# Altium footprint library Connectors.PcbLib: 133 footprints (part 1 of 9)
Each footprint in its own frame and in the unit in brackets; x right, y up, seen from the top. Pads: shape width x height; smd on the part's side, far side on the other; paste and mask are expansions set on the pad; w line width, h text height; cw(c..) or ccw(c..) is an arc to the next point about the centre after c.
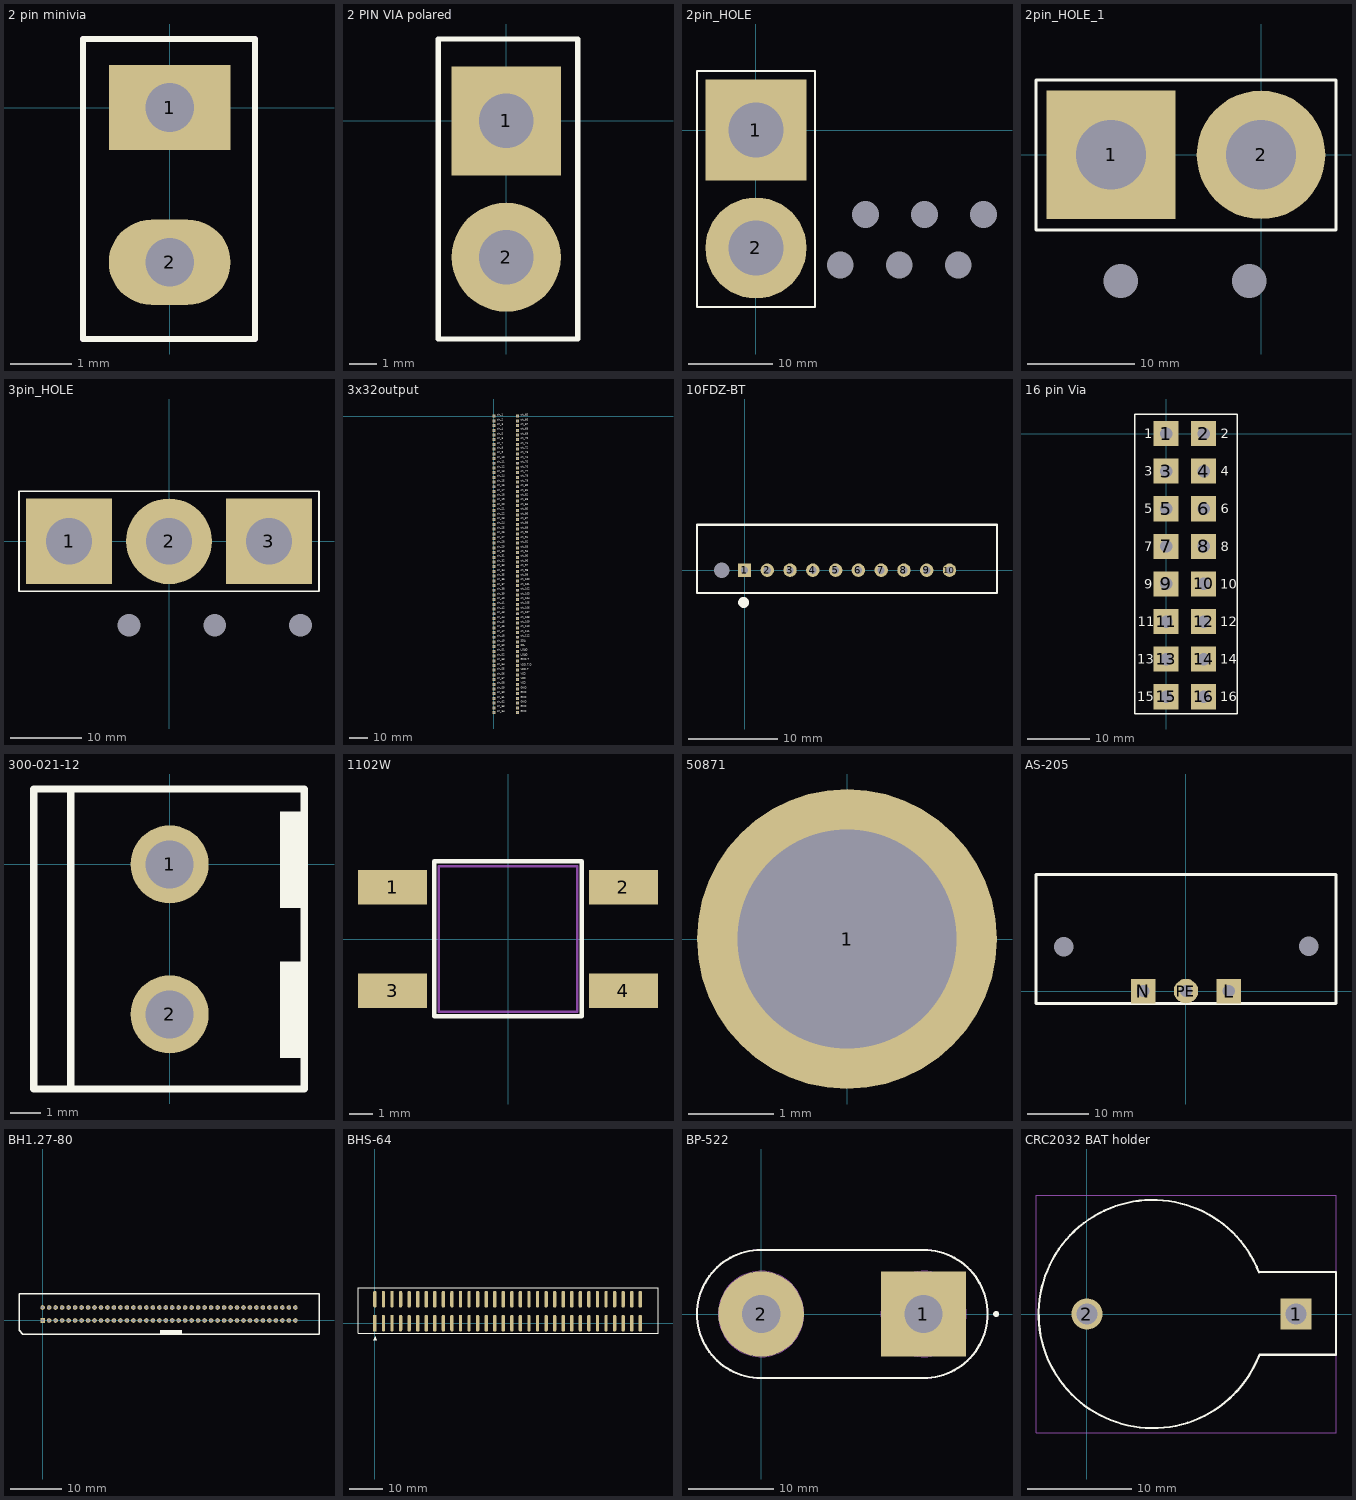
[diagram p0: the footprints below, top view; thin cyan lines are the x and y axes]

## 2 pin minivia [mm]
pads (2):
  rect 2x1.4 hole 0.8: 1(0,0)
  oval 2x1.4 hole 0.8: 2(0,-2.54)
Top Overlay:
  lines w0.1: -1.422,-3.8 -1.422,1.125 1.4,1.125 1.4,-3.8 -1.422,-3.8
Mechanical 29:
  lines w0.1: -1.422,-3.8 -1.422,1.125 1.4,1.125 1.4,-3.8 -1.422,-3.8
  text ".Designator" at 0,0 h1.5

## 2 PIN VIA polared [mm]
pads (2):
  rect 4x4 hole 2: 1(0,0)
  round 4 hole 2: 2(0,-5)
Top Overlay:
  lines w0.2: -2.5,-8 2.625,-8 2.625,3 -2.5,3 -2.5,-8
Bottom Overlay:
  lines w0.2: -2.5,-8 2.625,-8 2.625,3 -2.5,3 -2.5,-8

## 2pin_HOLE [mm]
pads (8):
  rect 12x12 hole 6.5: 1(0,0)
  round 12 hole 6.5: 2(0,-14)
  round 0 hole 3.2 unplated mask+1.7: NPTH(10,-16) NPTH(13,-10) NPTH(17,-16) NPTH(20,-10) NPTH(24,-16) NPTH(27,-10)
Top Overlay:
  lines w0.254: -7,-21 -7,7 7,7 7,-21 -7,-21

## 2pin_HOLE_1 [mm]
pads (4):
  rect 12x12 hole 6.5: 1(-14,0)
  round 12 hole 6.5: 2(0,0)
  round 0 hole 3.2 unplated mask+1.7: NPTH(-13.1,-11.764) NPTH(-1.1,-11.764)
Top Overlay:
  lines w0.254: -21,-7 7,-7 7,7 -21,7 -21,-7

## 3pin_HOLE [mm]
pads (6):
  rect 12x12 hole 6.5: 1(-14,0) 3(14,0)
  round 12 hole 6.5: 2(0,0)
  round 0 hole 3.2 unplated mask+1.7: NPTH(-5.6,-11.764) NPTH(6.4,-11.764) NPTH(18.4,-11.764)
Top Overlay:
  lines w0.254: -21,-7 21,-7 21,7 -21,7 -21,-7

## 3x32output [mm]
pads (128):
  rect 1.6x1.6 hole 1.1: 1(0,0) 2(0,-2.54) 3(0,-5.08) 4(0,-7.62) 5(0,-10.16) 6(0,-12.7) 7(0,-15.24) 8(0,-17.78) 9(0,-20.32) 10(0,-22.86) 11(0,-25.4) 12(0,-27.94) 13(0,-30.48) 14(0,-33.02) 15(0,-35.56) 16(0,-38.1) 17(0,-40.64) 18(0,-43.18) 19(0,-45.72) 20(0,-48.26) 21(0,-50.8) 22(0,-53.34) 23(0,-55.88) 24(0,-58.42) 25(0,-60.96) 26(0,-63.5) 27(0,-66.04) 28(0,-68.58) 29(0,-71.12) 30(0,-73.66) 31(0,-76.2) 32(0,-78.74) 33(0,-81.28) 34(0,-83.82) 35(0,-86.36) 36(0,-88.9) 37(0,-91.44) 38(0,-93.98) 39(0,-96.52) 40(0,-99.06) 41(0,-101.6) 42(0,-104.14) 43(0,-106.68) 44(0,-109.22) 45(0,-111.76) 46(0,-114.3) 47(0,-116.84) 48(0,-119.38) 49(0,-121.92) 50(0,-124.46) 51(0,-127) 52(0,-129.54) 53(0,-132.08) 54(0,-134.62) 55(0,-137.16) 56(0,-139.7) 57(0,-142.24) 58(0,-144.78) 59(0,-147.32) 60(0,-149.86) 61(0,-152.4) 62(0,-154.94) 63(0,-157.48) 64(0,-160.02) 65(12.7,0) 66(12.7,-2.54) 67(12.7,-5.08) 68(12.7,-7.62) 69(12.7,-10.16) 70(12.7,-12.7) 71(12.7,-15.24) 72(12.7,-17.78) 73(12.7,-20.32) 74(12.7,-22.86) 75(12.7,-25.4) 76(12.7,-27.94) 77(12.7,-30.48) 78(12.7,-33.02) 79(12.7,-35.56) 80(12.7,-38.1) 81(12.7,-40.64) 82(12.7,-43.18) 83(12.7,-45.72) 84(12.7,-48.26) 85(12.7,-50.8) 86(12.7,-53.34) 87(12.7,-55.88) 88(12.7,-58.42) 89(12.7,-60.96) 90(12.7,-63.5) 91(12.7,-66.04) 92(12.7,-68.58) 93(12.7,-71.12) 94(12.7,-73.66) 95(12.7,-76.2) 96(12.7,-78.74) 97(12.7,-81.28) 98(12.7,-83.82) 99(12.7,-86.36) 100(12.7,-88.9) 101(12.7,-91.44) 102(12.7,-93.98) 103(12.7,-96.52) 104(12.7,-99.06) 105(12.7,-101.6) 106(12.7,-104.14) 107(12.7,-106.68) 108(12.7,-109.22) 109(12.7,-111.76) 110(12.7,-114.3) 111(12.7,-116.84) 112(12.7,-119.38) 113(12.7,-121.92) 114(12.7,-124.46) 115(12.7,-127) 116(12.7,-129.54) 117(12.7,-132.08) 118(12.7,-134.62) 119(12.7,-137.16) 120(12.7,-139.7) 121(12.7,-142.24) 122(12.7,-144.78) 123(12.7,-147.32) 124(12.7,-149.86) 125(12.7,-152.4) 126(12.7,-154.94) 127(12.7,-157.48) 128(12.7,-160.02)
Top Overlay:
  text "ch_89" at 14.421,-61.29 h1.52
  text "ch_90" at 14.421,-63.83 h1.52
  text "ch_91" at 14.421,-66.37 h1.52
  text "ch_94" at 14.421,-73.99 h1.52
  text "ch_93" at 14.421,-71.45 h1.52
  text "ch_92" at 14.421,-68.91 h1.52
  text "ch_96" at 14.421,-79.07 h1.52
  text "ch_95" at 14.421,-76.53 h1.52
  text "ch_77" at 14.421,-30.81 h1.52
  text "ch_78" at 14.421,-33.35 h1.52
  text "ch_79" at 14.421,-35.89 h1.52
  text "ch_82" at 14.421,-43.51 h1.52
  text "ch_81" at 14.421,-40.97 h1.52
  text "ch_80" at 14.421,-38.43 h1.52
  text "ch_86" at 14.421,-53.67 h1.52
  text "ch_87" at 14.421,-56.21 h1.52
  text "ch_88" at 14.421,-58.75 h1.52
  text "ch_85" at 14.421,-51.13 h1.52
  text "ch_84" at 14.421,-48.59 h1.52
  text "ch_83" at 14.421,-46.05 h1.52
  text "ch_71" at 14.421,-15.57 h1.52
  text "ch_72" at 14.421,-18.11 h1.52
  text "ch_73" at 14.421,-20.65 h1.52
  text "ch_76" at 14.421,-28.27 h1.52
  text "ch_75" at 14.421,-25.73 h1.52
  text "ch_74" at 14.421,-23.19 h1.52
  text "ch_68" at 14.421,-7.95 h1.52
  text "ch_69" at 14.421,-10.49 h1.52
  text "ch_70" at 14.421,-13.03 h1.52
  text "ch_67" at 14.421,-5.41 h1.52
  text "ch_66" at 14.421,-2.87 h1.52
  text "ch_65" at 14.421,-0.33 h1.52
  text "ch_97" at 14.421,-81.61 h1.52
  text "ch_98" at 14.421,-84.15 h1.52
  text "ch_99" at 14.421,-86.69 h1.52
  text "ch_102" at 14.421,-94.31 h1.52
  text "ch_101" at 14.421,-91.77 h1.52
  text "ch_100" at 14.421,-89.23 h1.52
  text "ch_106" at 14.421,-104.47 h1.52
  text "ch_107" at 14.421,-107.01 h1.52
  text "ch_108" at 14.421,-109.55 h1.52
  text "ch_105" at 14.421,-101.93 h1.52
  text "ch_104" at 14.421,-99.39 h1.52
  text "ch_103" at 14.421,-96.85 h1.52
  text "LOAD" at 14.421,-127.33 h1.52
  text "LOAD" at 14.421,-129.87 h1.52
  text "GND.T" at 14.421,-132.41 h1.52
  text "VCCI" at 14.421,-140.03 h1.52
  text "VDD.T" at 14.421,-137.49 h1.2
  text "VDD.T.D" at 14.421,-134.95 h1.2
  text "ch_112" at 14.421,-119.71 h1.52
  text "SDA" at 14.421,-122.25 h1.52
  text "SCL" at 14.421,-124.79 h1.52
  text "ch_111" at 14.421,-117.17 h1.52
  text "ch_110" at 14.421,-114.63 h1.52
  text "ch_109" at 14.421,-112.09 h1.52
  text "GND" at 14.421,-157.81 h1.52
  text "GND" at 14.421,-160.35 h1.52
  text "GND" at 14.421,-150.19 h1.52
  text "GND" at 14.421,-152.73 h1.52
  text "GND" at 14.421,-155.27 h1.52
  text "GND" at 14.421,-147.65 h1.52
  text "VCCI" at 14.421,-145.11 h1.52
  text "VCCI" at 14.421,-142.57 h1.52
  text "ch_57" at 1.746,-142.57 h1.52
  text "ch_58" at 1.746,-145.11 h1.52
  text "ch_59" at 1.746,-147.65 h1.52
  text "ch_62" at 1.746,-155.27 h1.52
  text "ch_61" at 1.746,-152.73 h1.52
  text "ch_60" at 1.746,-150.19 h1.52
  text "ch_64" at 1.746,-160.35 h1.52
  text "ch_63" at 1.746,-157.81 h1.52
  text "ch_45" at 1.746,-112.09 h1.52
  text "ch_46" at 1.746,-114.63 h1.52
  text "ch_47" at 1.746,-117.17 h1.52
  text "ch_50" at 1.746,-124.79 h1.52
  text "ch_49" at 1.746,-122.25 h1.52
  text "ch_48" at 1.746,-119.71 h1.52
  text "ch_54" at 1.746,-134.95 h1.52
  text "ch_55" at 1.746,-137.49 h1.52
  text "ch_56" at 1.746,-140.03 h1.52
  text "ch_53" at 1.746,-132.41 h1.52
  text "ch_52" at 1.746,-129.87 h1.52
  text "ch_51" at 1.746,-127.33 h1.52
  text "ch_39" at 1.746,-96.85 h1.52
  text "ch_40" at 1.746,-99.39 h1.52
  text "ch_41" at 1.746,-101.93 h1.52
  text "ch_44" at 1.746,-109.55 h1.52
  text "ch_43" at 1.746,-107.01 h1.52
  text "ch_42" at 1.746,-104.47 h1.52
  text "ch_36" at 1.746,-89.23 h1.52
  text "ch_37" at 1.746,-91.77 h1.52
  text "ch_38" at 1.746,-94.31 h1.52
  text "ch_35" at 1.746,-86.69 h1.52
  text "ch_34" at 1.746,-84.15 h1.52
  text "ch_33" at 1.746,-81.61 h1.52
  text "ch_1" at 1.746,-0.33 h1.52
  text "ch_2" at 1.746,-2.87 h1.52
  text "ch_3" at 1.746,-5.41 h1.52
  text "ch_6" at 1.746,-13.03 h1.52
  text "ch_5" at 1.746,-10.49 h1.52
  text "ch_4" at 1.746,-7.95 h1.52
  text "ch_10" at 1.746,-23.19 h1.52
  text "ch_11" at 1.746,-25.73 h1.52
  text "ch_12" at 1.746,-28.27 h1.52
  text "ch_9" at 1.746,-20.65 h1.52
  text "ch_8" at 1.746,-18.11 h1.52
  text "ch_7" at 1.746,-15.57 h1.52
  text "ch_19" at 1.746,-46.05 h1.52
  text "ch_20" at 1.746,-48.59 h1.52
  text "ch_21" at 1.746,-51.13 h1.52
  text "ch_24" at 1.746,-58.75 h1.52
  text "ch_23" at 1.746,-56.21 h1.52
  text "ch_22" at 1.746,-53.67 h1.52
  text "ch_16" at 1.746,-38.43 h1.52
  text "ch_17" at 1.746,-40.97 h1.52
  text "ch_18" at 1.746,-43.51 h1.52
  text "ch_15" at 1.746,-35.89 h1.52
  text "ch_14" at 1.746,-33.35 h1.52
  text "ch_13" at 1.746,-30.81 h1.52
  text "ch_31" at 1.746,-76.53 h1.52
  text "ch_32" at 1.746,-79.07 h1.52
  text "ch_28" at 1.746,-68.91 h1.52
  text "ch_29" at 1.746,-71.45 h1.52
  text "ch_30" at 1.746,-73.99 h1.52
  text "ch_27" at 1.746,-66.37 h1.52
  text "ch_26" at 1.746,-63.83 h1.52
  text "ch_25" at 1.746,-61.29 h1.52
Bottom Overlay:
  text "VDD.T" at 17.679,-137.49 h1.2
  text "VDD.T.D" at 18.679,-134.95 h1.2
  text "ch_25" at 5.379,-61.29 h1.52
  text "ch_26" at 5.379,-63.83 h1.52
  text "ch_27" at 5.379,-66.37 h1.52
  text "ch_30" at 5.379,-73.99 h1.52
  text "ch_29" at 5.379,-71.45 h1.52
  text "ch_28" at 5.379,-68.91 h1.52
  text "ch_32" at 5.379,-79.07 h1.52
  text "ch_31" at 5.379,-76.53 h1.52
  text "ch_13" at 5.379,-30.81 h1.52
  text "ch_14" at 5.379,-33.35 h1.52
  text "ch_15" at 5.379,-35.89 h1.52
  text "ch_18" at 5.379,-43.51 h1.52
  text "ch_17" at 5.379,-40.97 h1.52
  text "ch_16" at 5.379,-38.43 h1.52
  text "ch_22" at 5.379,-53.67 h1.52
  text "ch_23" at 5.379,-56.21 h1.52
  text "ch_24" at 5.379,-58.75 h1.52
  text "ch_21" at 5.379,-51.13 h1.52
  text "ch_20" at 5.379,-48.59 h1.52
  text "ch_19" at 5.379,-46.05 h1.52
  text "ch_7" at 4.879,-15.57 h1.52
  text "ch_8" at 4.879,-18.11 h1.52
  text "ch_9" at 4.879,-20.65 h1.52
  text "ch_12" at 5.379,-28.27 h1.52
  text "ch_11" at 5.379,-25.73 h1.52
  text "ch_10" at 5.379,-23.19 h1.52
  text "ch_4" at 4.879,-7.95 h1.52
  text "ch_5" at 4.879,-10.49 h1.52
  text "ch_6" at 4.879,-13.03 h1.52
  text "ch_3" at 4.879,-5.41 h1.52
  text "ch_2" at 4.879,-2.87 h1.52
  text "ch_1" at 4.879,-0.33 h1.52
  text "ch_33" at 5.379,-81.61 h1.52
  text "ch_34" at 5.379,-84.15 h1.52
  text "ch_35" at 5.379,-86.69 h1.52
  text "ch_38" at 5.379,-94.31 h1.52
  text "ch_37" at 5.379,-91.77 h1.52
  text "ch_36" at 5.379,-89.23 h1.52
  text "ch_42" at 5.379,-104.47 h1.52
  text "ch_43" at 5.379,-107.01 h1.52
  text "ch_44" at 5.379,-109.55 h1.52
  text "ch_41" at 5.379,-101.93 h1.52
  text "ch_40" at 5.379,-99.39 h1.52
  text "ch_39" at 5.379,-96.85 h1.52
  text "ch_51" at 5.379,-127.33 h1.52
  text "ch_52" at 5.379,-129.87 h1.52
  text "ch_53" at 5.379,-132.41 h1.52
  text "ch_56" at 5.379,-140.03 h1.52
  text "ch_55" at 5.379,-137.49 h1.52
  text "ch_54" at 5.379,-134.95 h1.52
  text "ch_48" at 5.379,-119.71 h1.52
  text "ch_49" at 5.379,-122.25 h1.52
  text "ch_50" at 5.379,-124.79 h1.52
  text "ch_47" at 5.379,-117.17 h1.52
  text "ch_46" at 5.379,-114.63 h1.52
  text "ch_45" at 5.379,-112.09 h1.52
  text "ch_63" at 5.379,-157.81 h1.52
  text "ch_64" at 5.379,-160.35 h1.52
  text "ch_60" at 5.379,-150.19 h1.52
  text "ch_61" at 5.379,-152.73 h1.52
  text "ch_62" at 5.379,-155.27 h1.52
  text "ch_59" at 5.379,-147.65 h1.52
  text "ch_58" at 5.379,-145.11 h1.52
  text "ch_57" at 5.379,-142.57 h1.52
  text "VCCI" at 17.725,-142.57 h1.52
  text "VCCI" at 17.725,-145.11 h1.52
  text "GND" at 17.325,-147.65 h1.52
  text "GND" at 17.325,-155.27 h1.52
  text "GND" at 17.325,-152.73 h1.52
  text "GND" at 17.325,-150.19 h1.52
  text "GND" at 17.325,-160.35 h1.52
  text "GND" at 17.325,-157.81 h1.52
  text "ch_109" at 18.725,-112.09 h1.52
  text "ch_110" at 18.725,-114.63 h1.52
  text "ch_111" at 18.725,-117.17 h1.52
  text "SCL" at 17.425,-124.79 h1.52
  text "SDA" at 17.425,-122.25 h1.52
  text "ch_112" at 18.725,-119.71 h1.52
  text "VCCI" at 17.725,-140.03 h1.52
  text "GND.T" at 18.9,-132.4 h1.52
  text "LOAD" at 18.225,-129.87 h1.52
  text "LOAD" at 18.225,-127.33 h1.52
  text "ch_103" at 18.725,-96.85 h1.52
  text "ch_104" at 18.725,-99.39 h1.52
  text "ch_105" at 18.725,-101.93 h1.52
  text "ch_108" at 18.725,-109.55 h1.52
  text "ch_107" at 18.725,-107.01 h1.52
  text "ch_106" at 18.725,-104.47 h1.52
  text "ch_100" at 18.725,-89.23 h1.52
  text "ch_101" at 18.725,-91.77 h1.52
  text "ch_102" at 18.725,-94.31 h1.52
  text "ch_99" at 18.225,-86.69 h1.52
  text "ch_98" at 18.225,-84.15 h1.52
  text "ch_97" at 18.225,-81.61 h1.52
  text "ch_65" at 18.225,-0.33 h1.52
  text "ch_66" at 18.225,-2.87 h1.52
  text "ch_67" at 18.225,-5.41 h1.52
  text "ch_70" at 18.225,-13.03 h1.52
  text "ch_69" at 18.225,-10.49 h1.52
  text "ch_68" at 18.225,-7.95 h1.52
  text "ch_74" at 18.225,-23.19 h1.52
  text "ch_75" at 18.225,-25.73 h1.52
  text "ch_76" at 18.225,-28.27 h1.52
  text "ch_73" at 18.225,-20.65 h1.52
  text "ch_72" at 18.225,-18.11 h1.52
  text "ch_71" at 18.225,-15.57 h1.52
  text "ch_83" at 18.225,-46.05 h1.52
  text "ch_84" at 18.225,-48.59 h1.52
  text "ch_85" at 18.225,-51.13 h1.52
  text "ch_88" at 18.225,-58.75 h1.52
  text "ch_87" at 18.225,-56.21 h1.52
  text "ch_86" at 18.225,-53.67 h1.52
  text "ch_80" at 18.225,-38.43 h1.52
  text "ch_81" at 18.225,-40.97 h1.52
  text "ch_82" at 18.225,-43.51 h1.52
  text "ch_79" at 18.225,-35.89 h1.52
  text "ch_78" at 18.225,-33.35 h1.52
  text "ch_77" at 18.225,-30.81 h1.52
  text "ch_95" at 18.225,-76.53 h1.52
  text "ch_96" at 18.225,-79.07 h1.52
  text "ch_92" at 18.225,-68.91 h1.52
  text "ch_93" at 18.225,-71.45 h1.52
  text "ch_94" at 18.225,-73.99 h1.52
  text "ch_91" at 18.225,-66.37 h1.52
  text "ch_90" at 18.225,-63.83 h1.52
  text "ch_89" at 18.225,-61.29 h1.52

## 10FDZ-BT [mm]
height 12.7
pads (11):
  rect 1.5x1.5 hole 0.8: 1(0,0)
  round 1.5 hole 0.8: 2(2.54,0) 3(5.08,0) 4(7.62,0) 5(10.16,0) 6(12.7,0) 7(15.24,0) 8(17.78,0) 9(20.32,0) 10(22.86,0)
  round 0 hole 1.7 unplated: NPTH(-2.54,0)
Top Overlay:
  circle w1: c-0.1,-3.6 r0.1
  lines w0.254: -5.3,-2.54 28.16,-2.54 28.16,0 28.16,5.08 -5.3,5.08 -5.3,0 -5.3,-2.54
3D body "10FDZ-BT.step": height 10.3, standoff -3.4, extent -6.693,-2.599 29.567,5.101

## 16 pin Via [mm]
pads (16):
  rect 4x4 hole 2: 1(0,0) 2(6,0) 3(0,-6) 4(6,-6) 5(0,-12) 6(6,-12) 7(0,-18) 8(6,-18) 9(0,-24) 10(6,-24) 11(0,-30) 12(6,-30) 13(0,-36) 14(6,-36) 15(0,-42) 16(6,-42)
Top Overlay:
  lines w0.2: -5,-44.75 11.375,-44.75 11.375,3.125 -5,3.125 -5,-44.75
  text "2" at 8.75,-0.75 h1.52
  text "4" at 8.75,-6.75 h1.52
  text "6" at 8.75,-12.75 h1.52
  text "8" at 8.75,-18.75 h1.52
  text "10" at 8.625,-24.75 h1.52
  text "14" at 8.625,-36.75 h1.52
  text "16" at 8.625,-42.75 h1.52
  text "12" at 8.625,-30.75 h1.52
  text "11" at -4.5,-30.75 h1.52
  text "15" at -4.625,-42.75 h1.52
  text "13" at -4.625,-36.75 h1.52
  text "9" at -3.5,-24.75 h1.52
  text "7" at -3.5,-18.75 h1.52
  text "5" at -3.5,-12.75 h1.52
  text "3" at -3.5,-6.75 h1.52
  text "1" at -3.5,-0.75 h1.52

## 300-021-12 [mm]
pads (2):
  round 2.6 hole 1.6: 1(0,0) 2(0,-5)
Top Overlay:
  rectangle: 3.683,-1.448 4.479,1.753
  rectangle: 3.683,-6.448 4.479,-3.247
  lines w0.25: -3.302,-7.489 -3.302,2.511 -4.521,2.511 ; -4.521,2.511 4.479,2.511 4.479,-7.489 -4.521,-7.489 -4.521,2.511
3D body "PCB Screw Terminal Block 2P,5mm.STEP": height 15.4, standoff -3.3, extent -4.521,-7.489 4.479,2.511

## 1102W [mm]
height 6
pads (4):
  rect 3x1.5 smd: 1(-5,2.25) 2(5,2.25) 3(-5,-2.25) 4(5,-2.25)
Top Overlay:
  lines w0.2: -3.2,-3.35 3.2,-3.35 3.2,3.375 -3.2,3.375 -3.2,-3.35
Mechanical 15:
  lines w0.1: -3,-3.15 3,-3.15 3,3.15 -3,3.15 -3,-3.15
3D body "TACT SMD 6X6.step": height 5, standoff 0, extent -5,-3 5,3

## 50871 [mm]
pads (1):
  round 3.5 hole 2.56: 1(0,0)
3D body "c-50871-1-ae4-3d.stp": height 0.5, standoff -6.82, extent -1.46,-1.461 1.46,1.46

## AS-205 [mm]
height 30
pads (5):
  rect 4x4 hole 2: L(7,0) N(-7,0)
  round 0 hole 3.2 unplated mask+1.7: NPTH(-19.983,7.264) NPTH(20.022,7.289)
  round 4 hole 2: PE(0,0)
Top Overlay:
  lines w0.5: -24.5,-2 24.5,-2 24.5,19 -24.5,19 -24.5,-2
3D body "AS-205.STEP": height 26.8, standoff -3.8, extent -24.5,-2 24.5,19

## BH1.27-80 [mm] "вилка 1.27 на плату"
pads (80):
  rect 0.9x0.9 hole 0.6: 1(0,0)
  round 0.9 hole 0.6: 2(0,2.54) 3(1.27,0) 4(1.27,2.54) 5(2.54,0) 6(2.54,2.54) 7(3.81,0) 8(3.81,2.54) 9(5.08,0) 10(5.08,2.54) 11(6.35,0) 12(6.35,2.54) 13(7.62,0) 14(7.62,2.54) 15(8.89,0) 16(8.89,2.54) 17(10.16,0) 18(10.16,2.54) 19(11.43,0) 20(11.43,2.54) 21(12.7,0) 22(12.7,2.54) 23(13.97,0) 24(13.97,2.54) 25(15.24,0) 26(15.24,2.54) 27(16.51,0) 28(16.51,2.54) 29(17.78,0) 30(17.78,2.54) 31(19.05,0) 32(19.05,2.54) 33(20.32,0) 34(20.32,2.54) 35(21.59,0) 36(21.59,2.54) 37(22.86,0) 38(22.86,2.54) 39(24.13,0) 40(24.13,2.54) 41(25.4,0) 42(25.4,2.54) 43(26.67,0) 44(26.67,2.54) 45(27.94,0) 46(27.94,2.54) 47(29.21,0) 48(29.21,2.54) 49(30.48,0) 50(30.48,2.54) 51(31.75,0) 52(31.75,2.54) 53(33.02,0) 54(33.02,2.54) 55(34.29,0) 56(34.29,2.54) 57(35.56,0) 58(35.56,2.54) 59(36.83,0) 60(36.83,2.54) 61(38.1,0) 62(38.1,2.54) 63(39.37,0) 64(39.37,2.54) 65(40.64,0) 66(40.64,2.54) 67(41.91,0) 68(41.91,2.54) 69(43.18,0) 70(43.18,2.54) 71(44.45,0) 72(44.45,2.54) 73(45.72,0) 74(45.72,2.54) 75(46.99,0) 76(46.99,2.54) 77(48.26,0) 78(48.26,2.54) 79(49.53,0) 80(49.53,2.54)
Top Overlay:
  rectangle: 23.016,-2.717 27.266,-1.85
  lines w0.254: -4.648,-1.944 -3.874,-2.718 54.178,-2.718 54.178,5.258 -4.648,5.258 -4.648,-1.944
3D body "BH-90MS.STEP": height 7.41, standoff -2.89, extent -4.648,-2.73 54.172,5.27

## BHS-64 [mm]
pads (64):
  rect 1x5 smd: 1(0,0)
  oval 1x5 smd: 2(0,7.112) 3(2.54,0) 4(2.54,7.112) 5(5.08,0) 6(5.08,7.112) 7(7.62,0) 8(7.62,7.112) 9(10.16,0) 10(10.16,7.112) 11(12.7,0) 12(12.7,7.112) 13(15.24,0) 14(15.24,7.112) 15(17.78,0) 16(17.78,7.112) 17(20.32,0) 18(20.32,7.112) 19(22.86,0) 20(22.86,7.112) 21(25.4,0) 22(25.4,7.112) 23(27.94,0) 24(27.94,7.112) 25(30.48,0) 26(30.48,7.112) 27(33.02,0) 28(33.02,7.112) 29(35.56,0) 30(35.56,7.112) 31(38.1,0) 32(38.1,7.112) 33(40.64,0) 34(40.64,7.112) 35(43.18,0) 36(43.18,7.112) 37(45.72,0) 38(45.72,7.112) 39(48.26,0) 40(48.26,7.112) 41(50.8,0) 42(50.8,7.112) 43(53.34,0) 44(53.34,7.112) 45(55.88,0) 46(55.88,7.112) 47(58.42,0) 48(58.42,7.112) 49(60.96,0) 50(60.96,7.112) 51(63.5,0) 52(63.5,7.112) 53(66.04,0) 54(66.04,7.112) 55(68.58,0) 56(68.58,7.112) 57(71.12,0) 58(71.12,7.112) 59(73.66,0) 60(73.66,7.112) 61(76.2,0) 62(76.2,7.112) 63(78.74,0) 64(78.74,7.112)
Top Overlay:
  region: -0.425,-5.074 0.625,-5.074 0.075,-3.824
  lines w0.254: -5.01,-3.038 84,-3.038 84,10.541 -5.01,10.541 -5.01,-3.038
3D body "BHS-64.STEP": height 10.24, standoff 0.04, extent -5.01,-1.2 83.89,8.3

## BP-522 [mm]
height 10
pads (2):
  rect 10x10 hole 4.5: 1(19,0)
  round 10 hole 4.5: 2(0,0)
Top Overlay:
  circle w0.5: c27.5,0 r0.1
  lines w0.254: 0,-7.5 cw(c0,0) 0,7.5 19,7.5 cw(c19,0) 19,-7.5 0,-7.5
Mechanical 1:
  circle w0.013: c0,0 r5
  circle w0.013: c19,0 r5
  circle w0.013: c0,0 r2.5
  circle w0.013: c19,0 r2.5
  lines w0.013: 0,-7.5 cw(c0,0) 0,7.5 19,7.5 cw(c19,0) 19,-7.5 0,-7.5
3D body "Bp-522-3d.STEP": height 30.4, standoff -9.6, extent -7.5,-7.5 26.5,7.5

## CRC2032 BAT holder [mm]
pads (2):
  rect 3x3 hole 2: 1(20,0)
  round 3 hole 2: 2(0,0)
Top Overlay:
  lines w0.2: 16.466,3.987 ccw(c6.3,0) 16.5,-3.9 23.825,-3.9 23.825,4 16.5,4
Mechanical 29:
  lines w0.1: -4.875,-11.375 23.825,-11.375 23.825,11.375 -4.875,11.375 -4.875,-11.375
  text ".Designator" at 4.3,5.4 h1
3D body "CR 2032 Battery Holder.step": height 6.55, standoff -4, extent -4.875,-11.375 23.825,11.375